# Altium footprint library Connector.PcbLib: 148 footprints (part 10 of 10)
Each footprint in its own frame and in the unit in brackets; x right, y up, seen from the top. Pads: shape width x height; smd on the part's side, far side on the other; paste and mask are expansions set on the pad; w line width, h text height; cw(c..) or ccw(c..) is an arc to the next point about the centre after c.
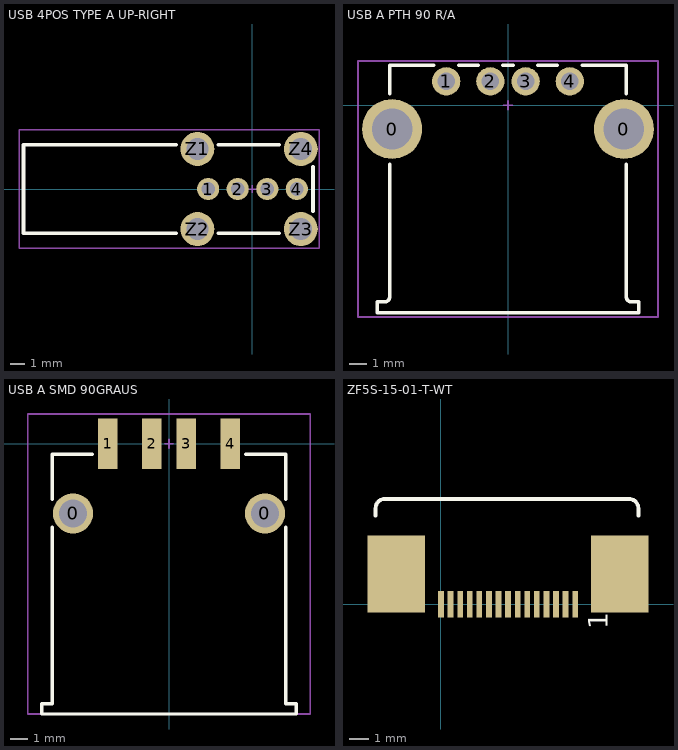
[diagram p9: the footprints below, top view; thin cyan lines are the x and y axes]

## USB 4POS TYPE A UP-RIGHT [mm]
height 14.5
pads (8):
  round 1.5 hole 0.92: 1(-3,0) 2(-1,0) 3(1,0) 4(3,0)
  round 2.3 hole 1.5: Z1(-3.73,2.71) Z2(-3.73,-2.71) Z3(3.27,-2.71) Z4(3.27,2.71)
Top Overlay:
  lines w0.254: -5.16,-3 -15.5,-3 -15.5,3 -5.16,3 ; -2.3,-3 1.8,-3 ; -2.3,3 1.8,3 ; 4.1,-1.5 4.1,1.5
Mechanical 15:
  lines w0.1: -0.25,0 0.25,0 ; 0,-0.25 0,0.25 ; -15.8,-4 -15.8,4 4.5,4 4.5,-4 -15.8,-4
3D body "STEP-614004134726-rev1.STEP": height 14.51, standoff -3.8, extent -15.345,-3.55 3.955,3.55

## USB A PTH 90 R/A [mm]
height 6.9
pads (6):
  round 3.4 hole 2.3: 0(-6.57,-1.35) 0(6.57,-1.35)
  round 1.6 hole 1: 1(-3.5,1.35) 2(-1,1.35) 3(1,1.35) 4(3.5,1.35)
Top Overlay:
  lines w0.2: -6.7,-3.35 -6.7,-10.85 cw(c-7,-10.85) -7,-11.15 -7.4,-11.15 -7.4,-11.75 7.4,-11.75 7.4,-11.15 7,-11.15 cw(c7,-10.85) 6.7,-10.85 6.7,-3.35 ; -6.7,0.65 -6.7,2.25 -4.2,2.25 ; -2.8,2.25 -1.7,2.25 ; -0.3,2.25 0.3,2.25 ; 1.7,2.25 2.8,2.25 ; 4.2,2.25 6.7,2.25 6.7,0.65
Mechanical 15:
  lines w0.1: -0.25,0 0.25,0 ; 0,-0.25 0,0.25 ; -8.5,-12 8.5,-12 8.5,2.5 -8.5,2.5 -8.5,-12
3D body "M-UE27-AC54-100-REVT1.STEP": height 7.7, standoff -3.05, extent -7.426,-11.65 7.426,2.15

## USB A SMD 90GRAUS [mm] "USB Type A, Receptacle, Standard, SMT, 30u GXT Contact, 4 Pins, Shield with Ni Plating, 1.57 mm PCB, White HSG."
pads (6):
  round 2.3 hole 1.6: 0(-5.5,-4) 0(5.5,-4)
  rect 1.12x2.88 smd: 1(-3.5,0) 2(-1,0) 3(1,0) 4(3.5,0)
Top Overlay:
  lines w0.2: -6.7,-4.8 -6.7,-14.9 -7.3,-14.9 -7.3,-15.5 7.3,-15.5 7.3,-14.9 6.7,-14.9 6.7,-4.8 ; -6.7,-3.2 -6.7,-0.6 -4.4,-0.6 ; 4.4,-0.6 6.7,-0.6 6.7,-3.2
Mechanical 15:
  lines w0.1: -0.25,0 0.25,0 ; 0,-0.25 0,0.25 ; -8.1,-15.5 8.1,-15.5 8.1,1.7 -8.1,1.7 -8.1,-15.5
3D body "14377.stp": height 7.5, standoff -3.4, extent -7.9,-15.3 7.9,0.7

## ZF5S-15-01-T-WT [mm]
pads (17):
  rect 0.3x1.4 smd: 1(7,0) 2(6.5,0) 3(6,0) 4(5.5,0) 5(5,0) 6(4.5,0) 7(4,0) 8(3.5,0) 9(3,0) 10(2.5,0) 11(2,0) 12(1.5,0) 13(1,0) 14(0.5,0) 15(0,0)
  rect 3x4 smd: ""(-2.33,1.58) ""(9.324,1.58)
Top Overlay:
  lines w0.2: -3.414,4.614 -3.414,5 cw(c-2.914,5) -2.914,5.5 9.8,5.5 cw(c9.8,5) 10.3,5 10.3,4.625
  text "1" at 8.7,-1.3 h1
3D body "ZF5S-15-01-T-WT.STEP": height 2.08, standoff -0.02, extent -3.076,-0.384 10.074,5.286